# Altium footprint library JL_PCB.PCBLIB: 1112 footprints (part 60 of 71)
Each footprint in its own frame and in the unit in brackets; x right, y up, seen from the top. Pads: shape width x height; smd on the part's side, far side on the other; paste and mask are expansions set on the pad; w line width, h text height; cw(c..) or ccw(c..) is an arc to the next point about the centre after c.
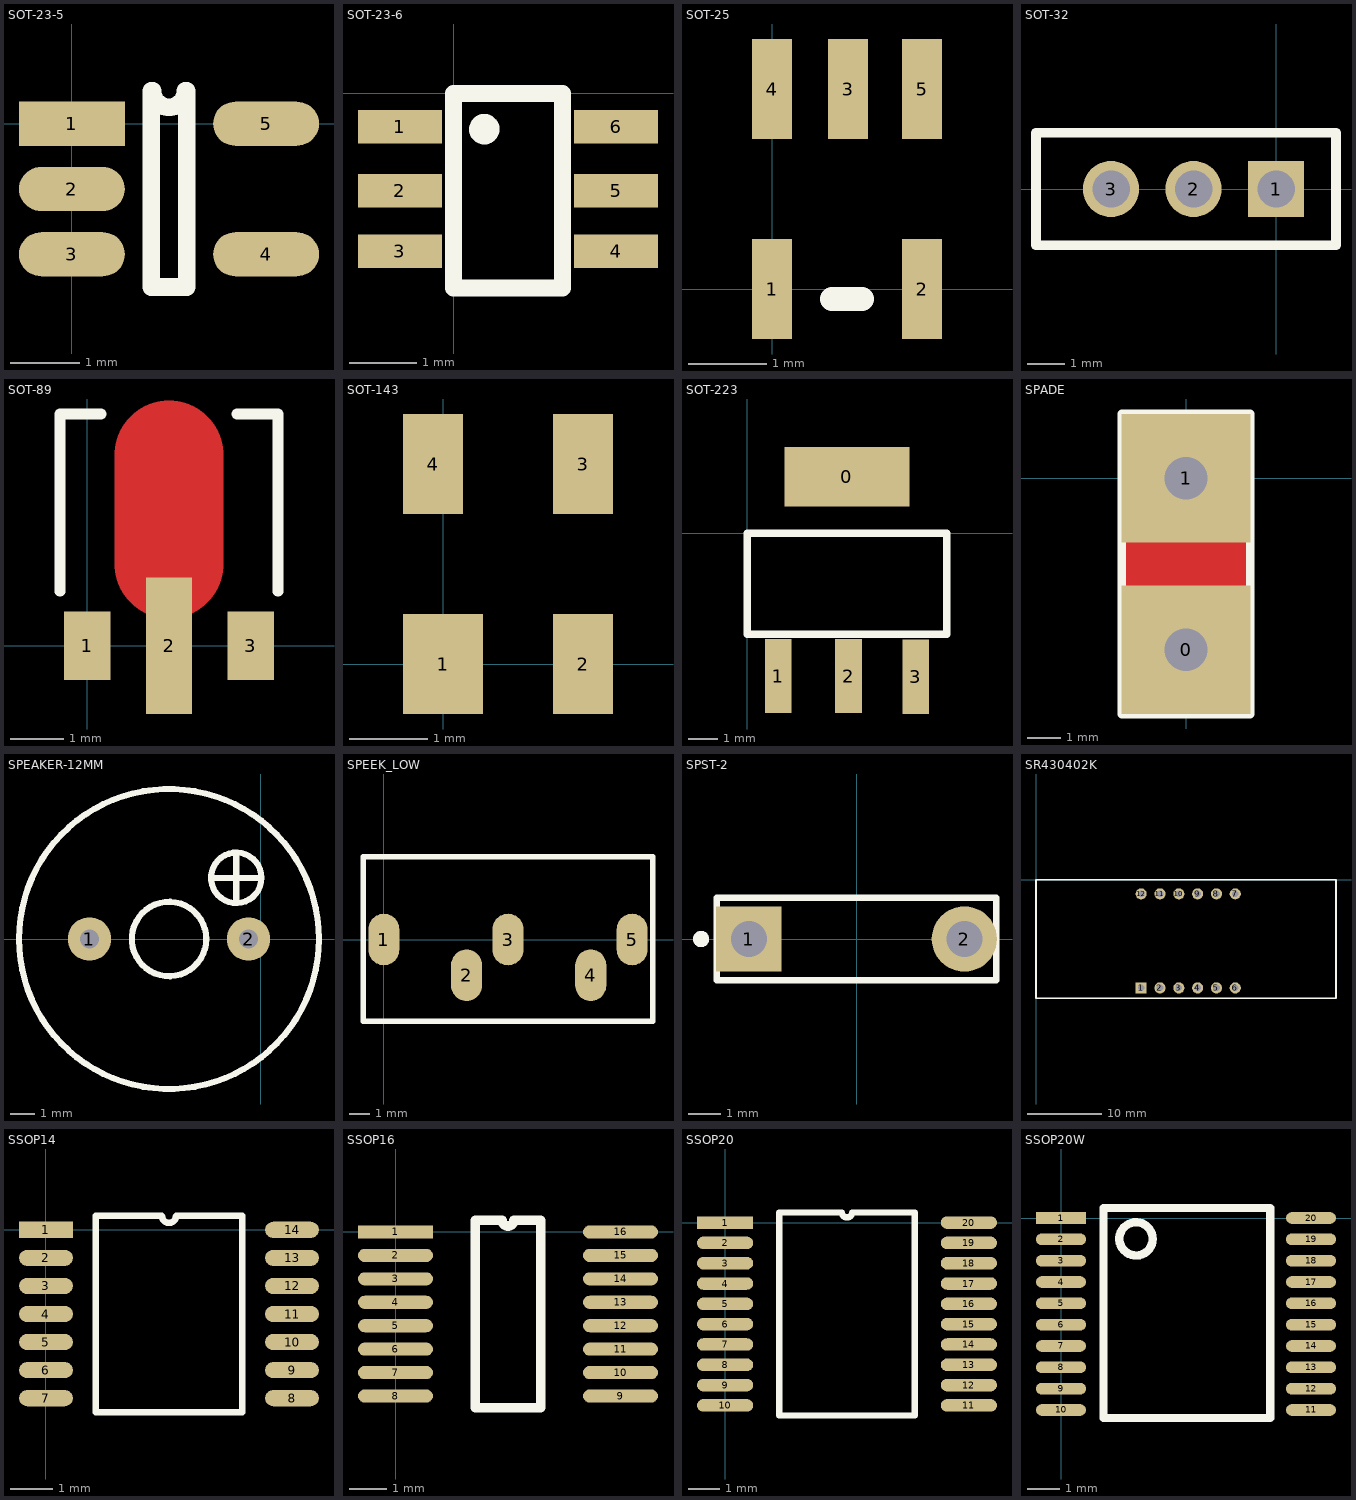
[diagram p59: the footprints below, top view; thin cyan lines are the x and y axes]

## SOT-23-5 [mil]
pads (5):
  rect 60x25 smd: 1(0,0)
  oval 60x25 smd: 2(0,-37) 3(0,-74) 4(110,-74) 5(110,0)
TopOverlay:
  lines w10: 45,18.5 45,-92.5 65,-92.5 65,18.5 ; 45.75,18.5 ccw(c55,18.5) 64.25,18.5
3D body "SOT-23-5.STEP": height 47.24, standoff 0, extent -2.11,-93.09 108.12,21.09

## SOT-23-6 [mm]
height 1.25
pads (6):
  rect 1.25x0.5 smd: 1(-0.8,-0.5) 2(-0.8,-1.45) 3(-0.8,-2.35) 4(2.425,-2.35) 5(2.425,-1.45) 6(2.425,-0.5)
TopOverlay:
  lines w0.254: 0.555,-0.506 ccw(c0.459,-0.533) 0.559,-0.533 ; 0,-2.9 0,0 1.625,0 1.625,-2.9 0,-2.9
3D body "User Library-SOT-23-6.step": height 1.11, standoff 0.02, extent -0.419,-2.845 2.007,-0.051

## SOT-25 [mil]
pads (5):
  rect 20x50 smd: 1(0,0) 2(75,0) 3(38,100) 4(0,100) 5(75,100)
TopOverlay:
  lines w12: 30,-5 45,-5

## SOT-32 [mm]
pads (3):
  rect 1.5x1.5 hole 1: 1(0,0)
  round 1.5 hole 1: 2(-2.2,0) 3(-4.4,0)
TopOverlay:
  lines w0.254: -4.4,1.5 -6.4,1.5 ; -6.4,1.5 1.6,1.5 1.6,-1.5 -6.4,-1.5 -6.4,1.5

## SOT-89 [mil]
pads (3):
  rect 34x50 smd: 1(0,0) 3(120,0)
  rect 34x100 smd: 2(60,0)
TopLayer:
  lines w80: 60,60 60,140
TopOverlay:
  lines w8: -20,40 -20,170 10,170 ; 110,170 140,170 140,40

## SOT-143 [mil]
pads (4):
  rect 40x50 smd: 1(0,0)
  rect 30x50 smd: 2(70,0) 3(70,100) 4(-5,100)

## SOT-223 [mm]
height 1.8
pads (4):
  rect 4.2x2 smd: 0(3.35,1.9)
  rect 0.9x2.5 smd: 1(1.041,-4.801) 2(3.404,-4.801) 3(5.664,-4.826)
TopOverlay:
  lines w0.254: 0,-3.4 0,0 6.7,0 6.7,-3.4 0,-3.4
3D body "SOT-223.STEP": height 1.86, standoff -0.06, extent 0.03,-5.3 6.736,1.904

## SPADE [mil]
pads (2):
  rect 150x150 hole 50: 0(0,-200) 1(0,0)
TopLayer:
  rectangle: -75,-150 75,-50
BottomLayer:
  rectangle: -75,-150 75,-50
TopOverlay:
  lines w10: -75,-275 -75,75 75,75 75,-275 -75,-275

## SPEAKER-12MM [mm]
pads (2):
  round 1.8 hole 0.8: 1(-7.112,0) 2(-0.508,0)
TopOverlay:
  circle w0.254: c-3.81,0 r6.227
  circle w0.254: c-1.016,2.54 r1.047
  circle w0.254: c-3.81,0 r1.545
  lines w0.254: -2.032,2.54 0.031,2.54 ; -1.016,1.524 -1.016,3.556

## SPEEK_LOW [mm]
pads (5):
  oval 1.5x2.5 all layers, no hole: 1(0,0) 2(4,-1.73) 3(6,0) 4(10,-1.73) 5(12,0)
TopOverlay:
  lines w0.254: -1,-3.95 13,-3.95 13,4 -1,4 -1,-3.95
Mechanical1:
  lines w0.254: -0.35,-0.65 ccw(c-0.05,-0.65) -0.05,-0.95 0.05,-0.95 ccw(c0.05,-0.65) 0.35,-0.65 0.35,0.65 ccw(c0.05,0.65) 0.05,0.95 -0.05,0.95 ccw(c-0.05,0.65) -0.35,0.65 -0.35,-0.65 ; 3.65,-2.35 ccw(c3.95,-2.35) 3.95,-2.65 4.05,-2.65 ccw(c4.05,-2.35) 4.35,-2.35 4.35,-1.05 ccw(c4.05,-1.05) 4.05,-0.75 3.95,-0.75 ccw(c3.95,-1.05) 3.65,-1.05 3.65,-2.35 ; 5.65,-0.6 ccw(c5.95,-0.6) 5.95,-0.9 6.05,-0.9 ccw(c6.05,-0.6) 6.35,-0.6 6.35,0.7 ccw(c6.05,0.7) 6.05,1 5.95,1 ccw(c5.95,0.7) 5.65,0.7 5.65,-0.6 ; 9.65,-2.4 ccw(c9.95,-2.4) 9.95,-2.7 10.05,-2.7 ccw(c10.05,-2.4) 10.35,-2.4 10.35,-1.1 ccw(c10.05,-1.1) 10.05,-0.8 9.95,-0.8 ccw(c9.95,-1.1) 9.65,-1.1 9.65,-2.4 ; 11.65,-0.65 ccw(c11.95,-0.65) 11.95,-0.95 12.05,-0.95 ccw(c12.05,-0.65) 12.35,-0.65 12.35,0.65 ccw(c12.05,0.65) 12.05,0.95 11.95,0.95 ccw(c11.95,0.65) 11.65,0.65 11.65,-0.65

## SPST-2 [mm] "Circuit Breaker; 2 Leads"
pads (2):
  rect 2x2 hole 1.1: 1(-3.3,0)
  round 2 hole 1.1: 2(3.3,0)
TopOverlay:
  circle w0.25: c-4.761,-0.001 r0.125
  lines w0.2: -4.28,-1.27 4.28,-1.27 4.28,1.27 -4.28,1.27 -4.28,-1.27

## SR430402K [mm]
pads (12):
  rect 1.5x1.5 hole 0.9: 1(14.2,-14.6)
  round 1.5 hole 0.9: 2(16.74,-14.6) 3(19.28,-14.6) 4(21.82,-14.6) 5(24.36,-14.6) 6(26.9,-14.6) 7(26.9,-1.9) 8(24.36,-1.9) 9(21.82,-1.9) 10(19.28,-1.9) 11(16.74,-1.9) 12(14.2,-1.9)
TopOverlay:
  lines w0.203: 0,-16 40.5,-16 40.5,0 0,0 0,-16
3D body "0.4寸8": height 7, standoff -1.1, extent 0.129,-15.975 40.309,0.025

## SSOP14 [mil]
pads (14):
  rect 50x15 smd: 1(0,0)
  oval 50x15 smd: 2(0,-26) 3(0,-52) 4(0,-78) 5(0,-104) 6(0,-130) 7(0,-156) 8(228,-156) 9(228,-130) 10(228,-104) 11(228,-78) 12(228,-52) 13(228,-26) 14(228,0)
TopOverlay:
  lines w6: 46,-169 182,-169 182,13 120.5,13 cw(c114,13) 107.5,13 46,13 46,-169

## SSOP16 [mil]
pads (16):
  rect 80x14 smd: 1(0,0)
  oval 80x14 smd: 2(0,-25) 3(0,-50) 4(0,-75) 5(0,-100) 6(0,-125) 7(0,-150) 8(0,-175) 9(240,-175) 10(240,-150) 11(240,-125) 12(240,-100) 13(240,-75) 14(240,-50) 15(240,-25) 16(240,0)
TopOverlay:
  lines w10: 85,-187.5 85,12.5 113.75,12.5 ccw(c120,12.5) 126.25,12.5 155,12.5 155,-187.5 85,-187.5

## SSOP20 [mm]
pads (20):
  rect 1.8x0.4 smd: 1(0,0)
  oval 1.8x0.4 smd: 2(0,-0.65) 3(0,-1.3) 4(0,-1.95) 5(0,-2.6) 6(0,-3.25) 7(0,-3.9) 8(0,-4.55) 9(0,-5.2) 10(0,-5.85) 11(7.8,-5.85) 12(7.8,-5.2) 13(7.8,-4.55) 14(7.8,-3.9) 15(7.8,-3.25) 16(7.8,-2.6) 17(7.8,-1.95) 18(7.8,-1.3) 19(7.8,-0.65) 20(7.8,0)
TopOverlay:
  lines w0.2: 1.735,-6.175 6.065,-6.175 6.065,0.325 4.063,0.325 cw(c3.9,0.325) 3.737,0.325 1.735,0.325 1.735,-6.175

## SSOP20W [mil]
pads (20):
  rect 60x14 smd: 1(0,0)
  oval 60x14 smd: 2(0,-25.59) 3(0,-51.18) 4(0,-76.77) 5(0,-102.36) 6(0,-127.95) 7(0,-153.54) 8(0,-179.13) 9(0,-204.72) 10(0,-230.31) 11(300,-230.31) 12(300,-204.72) 13(300,-179.13) 14(300,-153.54) 15(300,-127.95) 16(300,-102.36) 17(300,-76.77) 18(300,-51.18) 19(300,-25.59) 20(300,0)
TopOverlay:
  circle w10: c90,-25 r20
  lines w10: 51,-240 51,12 251,12 251,-240 51,-240